# Altium footprint library Socket DIP.PCBLIB: 18 footprints (part 1 of 2)
Each footprint in its own frame and in the unit in brackets; x right, y up, seen from the top. Pads: shape width x height; smd on the part's side, far side on the other; paste and mask are expansions set on the pad; w line width, h text height; cw(c..) or ccw(c..) is an arc to the next point about the centre after c.
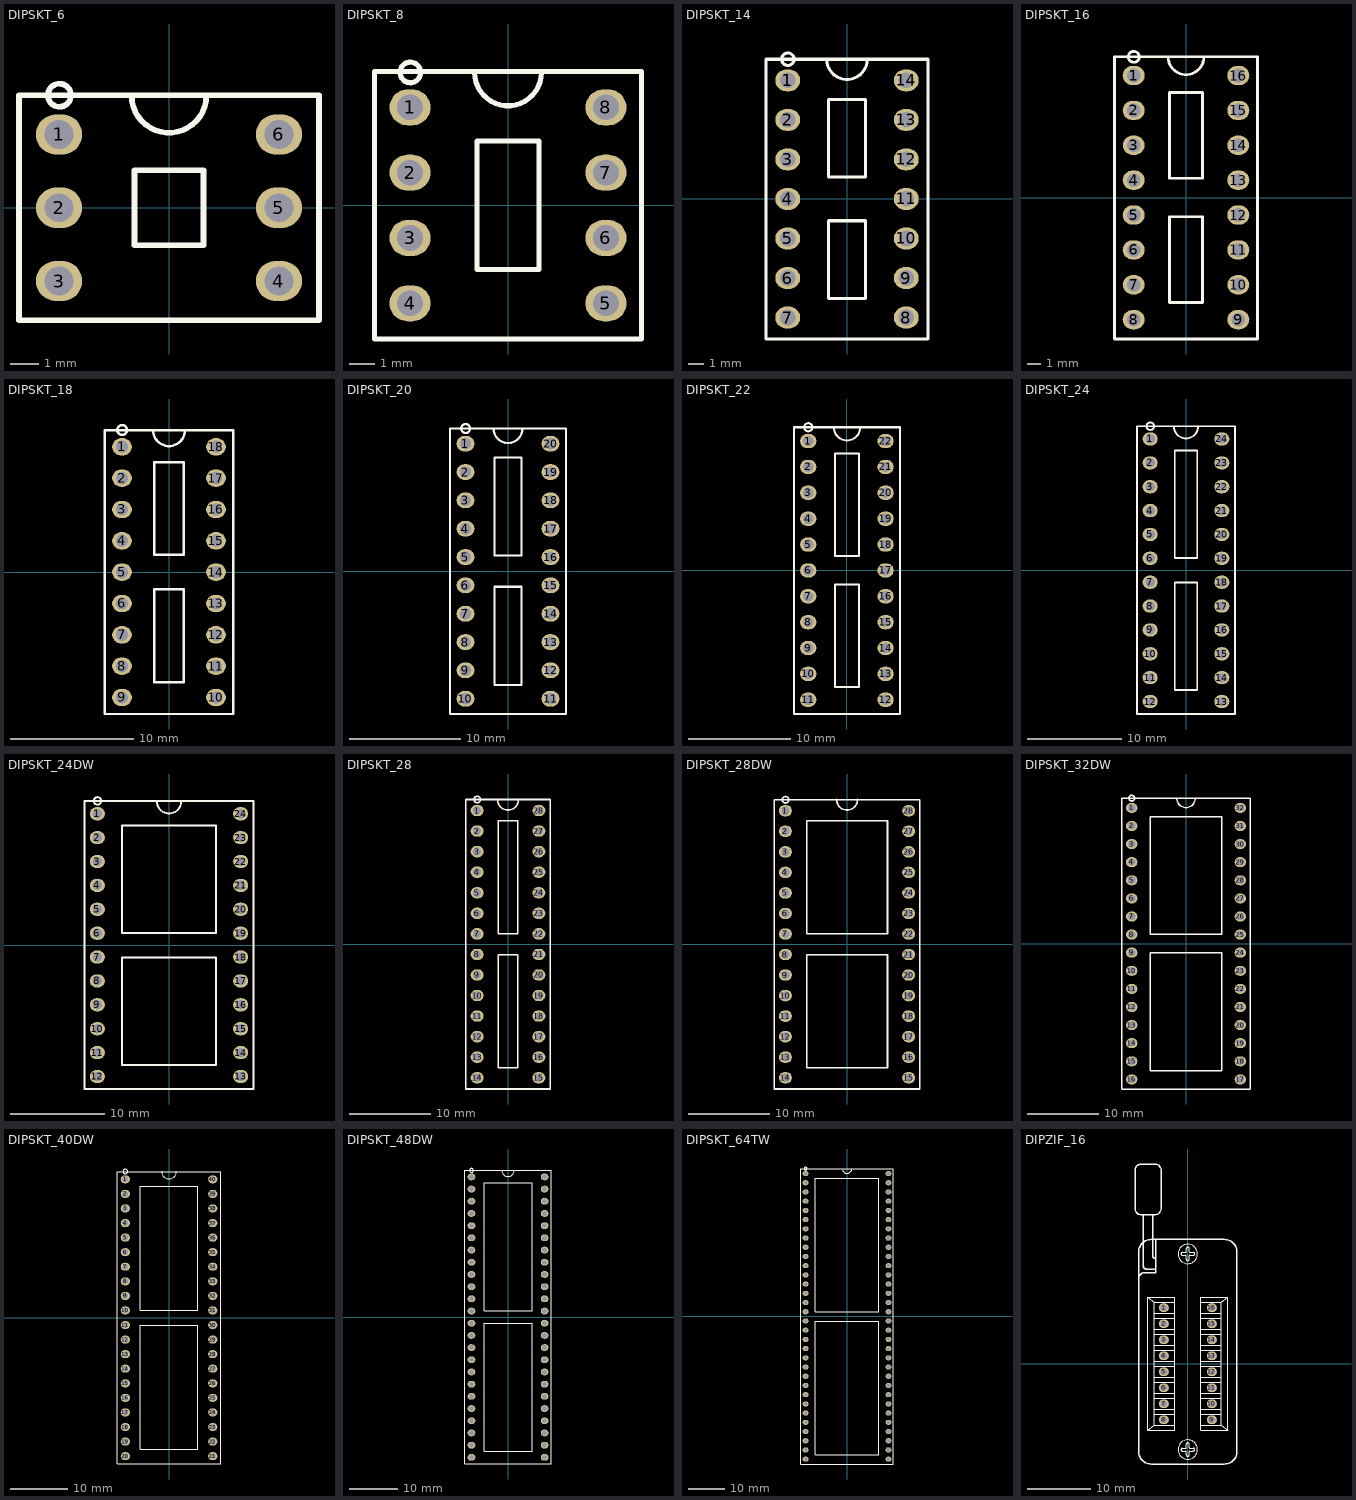
[diagram p0: the footprints below, top view; thin cyan lines are the x and y axes]

## DIPSKT_6 [mm] "SOCKET DIP, pitch 2.54mm, 300mil Width"
pads (6):
  oval 1.6x1.4 / inner round 1.4 / far side oval 2.2x1.4 hole 1: 1(-3.81,2.54) 2(-3.81,0) 3(-3.81,-2.54) 4(3.81,-2.54) 5(3.81,0) 6(3.81,2.54)
TopOverlay:
  circle w0.2: c-3.8,3.9 r0.4
  lines w0.2: -1.3,3.9 ccw(c0,3.9) 1.3,3.9 ; -5.2,-3.9 -5.2,3.9 5.2,3.9 5.2,-3.9 -5.2,-3.9 ; -1.2,-1.3 -1.2,1.3 1.2,1.3 1.2,-1.3 -1.2,-1.3
3D body "User Library-6pin 0_3inch 2_54mm IC DIP Gold Socket.step": height 5, standoff -3, extent -5.08,-3.8 5.08,3.82

## DIPSKT_8 [mm] "SOCKET DIP, pitch 2.54mm, 300mil Width"
pads (8):
  oval 1.6x1.4 / inner round 1.4 / far side oval 2.2x1.4 hole 1: 1(-3.81,3.81) 2(-3.81,1.27) 3(-3.81,-1.27) 4(-3.81,-3.81) 5(3.81,-3.81) 6(3.81,-1.27) 7(3.81,1.27) 8(3.81,3.81)
TopOverlay:
  circle w0.2: c-3.8,5.17 r0.4
  lines w0.2: -1.3,5.17 ccw(c0,5.17) 1.3,5.17 ; -5.2,-5.2 -5.2,5.2 5.2,5.2 5.2,-5.2 -5.2,-5.2 ; -1.2,-2.5 -1.2,2.5 1.2,2.5 1.2,-2.5 -1.2,-2.5
3D body "User Library-8pin 0_3inch 2_54mm IC DIP Gold Socket.step": height 5, standoff -3, extent -5.06,-5.08 5.1,5.08

## DIPSKT_14 [mm] "SOCKET DIP, pitch 2.54mm, 300mil Width"
pads (14):
  oval 1.6x1.4 / inner round 1.4 / far side oval 2.2x1.4 hole 1: 1(-3.81,7.62) 2(-3.81,5.08) 3(-3.81,2.54) 4(-3.81,0) 5(-3.81,-2.54) 6(-3.81,-5.08) 7(-3.81,-7.62) 8(3.81,-7.62) 9(3.81,-5.08) 10(3.81,-2.54) 11(3.81,0) 12(3.81,2.54) 13(3.81,5.08) 14(3.81,7.62)
TopOverlay:
  circle w0.2: c-3.8,8.98 r0.4
  lines w0.2: -1.3,8.98 ccw(c0,8.98) 1.3,8.98 ; -5.2,-9 -5.2,8.98 5.2,8.98 5.2,-9 -5.2,-9 ; -1.2,-6.4 1.2,-6.4 1.2,-1.4 -1.2,-1.4 -1.2,-6.4 ; -1.2,1.4 -1.2,6.4 1.2,6.4 1.2,1.4 -1.2,1.4
3D body "User Library-14pin 0_3inch 2_54mm IC DIP Socket.step": height 5, standoff -3, extent -5.08,-8.9 5.08,8.88

## DIPSKT_16 [mm] "SOCKET DIP, pitch 2.54mm, 300mil Width"
pads (16):
  oval 1.6x1.4 / inner round 1.4 / far side oval 2.2x1.4 hole 1: 1(-3.81,8.89) 2(-3.81,6.35) 3(-3.81,3.81) 4(-3.81,1.27) 5(-3.81,-1.27) 6(-3.81,-3.81) 7(-3.81,-6.35) 8(-3.81,-8.89) 9(3.81,-8.89) 10(3.81,-6.35) 11(3.81,-3.81) 12(3.81,-1.27) 13(3.81,1.27) 14(3.81,3.81) 15(3.81,6.35) 16(3.81,8.89)
TopOverlay:
  circle w0.2: c-3.8,10.25 r0.4
  lines w0.2: -1.3,10.25 ccw(c0,10.25) 1.3,10.25 ; -5.2,-10.3 -5.2,10.25 5.2,10.25 5.2,-10.3 -5.2,-10.3 ; -1.2,-7.65 1.2,-7.65 1.2,-1.4 -1.2,-1.4 -1.2,-7.65 ; -1.2,1.4 -1.2,7.65 1.2,7.65 1.2,1.4 -1.2,1.4
3D body "User Library-16pin 0_3inch 2_54mm IC DIP Gold Socket.step": height 5, standoff -3, extent -5.06,-10.16 5.1,10.16

## DIPSKT_18 [mm] "SOCKET DIP, pitch 2.54mm, 300mil Width"
pads (18):
  oval 1.6x1.4 / inner round 1.4 / far side oval 2.2x1.4 hole 1: 1(-3.81,10.16) 2(-3.81,7.62) 3(-3.81,5.08) 4(-3.81,2.54) 5(-3.81,0) 6(-3.81,-2.54) 7(-3.81,-5.08) 8(-3.81,-7.62) 9(-3.81,-10.16) 10(3.81,-10.16) 11(3.81,-7.62) 12(3.81,-5.08) 13(3.81,-2.54) 14(3.81,0) 15(3.81,2.54) 16(3.81,5.08) 17(3.81,7.62) 18(3.81,10.16)
TopOverlay:
  circle w0.2: c-3.8,11.52 r0.4
  lines w0.2: -1.3,11.52 ccw(c0,11.52) 1.3,11.52 ; -5.2,-11.5 5.2,-11.5 5.2,11.52 -5.2,11.52 -5.2,-11.5 ; -1.2,-8.92 -1.2,-1.4 1.2,-1.4 1.2,-8.92 -1.2,-8.92 ; -1.2,1.4 1.2,1.4 1.2,8.92 -1.2,8.92 -1.2,1.4
3D body "User Library-18pin 0_3inch 2_54mm IC DIP Gold Socket.step": height 5, standoff -3, extent -5.08,-11.4 5.08,11.46

## DIPSKT_20 [mm] "SOCKET DIP, pitch 2.54mm, 300mil Width"
pads (20):
  oval 1.6x1.4 / inner round 1.4 / far side oval 2.2x1.4 hole 1: 1(-3.81,11.43) 2(-3.81,8.89) 3(-3.81,6.35) 4(-3.81,3.81) 5(-3.81,1.27) 6(-3.81,-1.27) 7(-3.81,-3.81) 8(-3.81,-6.35) 9(-3.81,-8.89) 10(-3.81,-11.43) 11(3.81,-11.43) 12(3.81,-8.89) 13(3.81,-6.35) 14(3.81,-3.81) 15(3.81,-1.27) 16(3.81,1.27) 17(3.81,3.81) 18(3.81,6.35) 19(3.81,8.89) 20(3.81,11.43)
TopOverlay:
  circle w0.2: c-3.8,12.79 r0.4
  lines w0.2: -1.3,12.79 ccw(c0,12.79) 1.3,12.79 ; -5.2,-12.8 -5.2,12.79 5.2,12.79 5.2,-12.8 -5.2,-12.8 ; -1.2,-10.19 1.2,-10.19 1.2,-1.4 -1.2,-1.4 -1.2,-10.19 ; -1.2,1.4 -1.2,10.19 1.2,10.19 1.2,1.4 -1.2,1.4
3D body "User Library-20pin 0_3inch 2_54mm IC DIP Gold Socket.step": height 5, standoff -3, extent -5.08,-12.7 5.08,12.7

## DIPSKT_22 [mm] "SOCKET DIP, pitch 2.54mm, 400mil Width, 28X10mm"
pads (22):
  oval 1.6x1.4 / inner round 1.4 / far side oval 2.2x1.4 hole 1: 1(-3.8,12.7) 2(-3.8,10.16) 3(-3.8,7.62) 4(-3.8,5.08) 5(-3.8,2.54) 6(-3.8,0) 7(-3.8,-2.54) 8(-3.8,-5.08) 9(-3.8,-7.62) 10(-3.8,-10.16) 11(-3.8,-12.7) 12(3.8,-12.7) 13(3.8,-10.16) 14(3.8,-7.62) 15(3.8,-5.08) 16(3.8,-2.54) 17(3.8,0) 18(3.8,2.54) 19(3.8,5.08) 20(3.8,7.62) 21(3.8,10.16) 22(3.8,12.7)
TopOverlay:
  circle w0.2: c-3.79,14.06 r0.4
  lines w0.2: -1.29,14.06 ccw(c0.01,14.06) 1.31,14.06 ; -5.19,-14.1 -5.19,14.06 5.21,14.06 5.21,-14.1 -5.19,-14.1 ; -1.19,-11.46 1.21,-11.46 1.21,-1.4 -1.19,-1.4 -1.19,-11.46 ; -1.19,1.4 -1.19,11.46 1.21,11.46 1.21,1.4 -1.19,1.4
3D body "User Library-22pin 0_3inch 2_54mm IC DIP Gold Socket.step": height 5, standoff -3, extent -5.06,-13.97 5.1,13.97

## DIPSKT_24 [mm] "SOCKET DIP, pitch 2.54mm, 300mil Width"
pads (24):
  oval 1.6x1.4 / inner round 1.4 / far side oval 2.2x1.4 hole 1: 1(-3.81,13.97) 2(-3.81,11.43) 3(-3.81,8.89) 4(-3.81,6.35) 5(-3.81,3.81) 6(-3.81,1.27) 7(-3.81,-1.27) 8(-3.81,-3.81) 9(-3.81,-6.35) 10(-3.81,-8.89) 11(-3.81,-11.43) 12(-3.81,-13.97) 13(3.81,-13.97) 14(3.81,-11.43) 15(3.81,-8.89) 16(3.81,-6.35) 17(3.81,-3.81) 18(3.81,-1.27) 19(3.81,1.27) 20(3.81,3.81) 21(3.81,6.35) 22(3.81,8.89) 23(3.81,11.43) 24(3.81,13.97)
TopOverlay:
  circle w0.2: c-3.8,15.33 r0.4
  lines w0.2: -1.3,15.33 ccw(c0,15.33) 1.3,15.33 ; -5.2,-15.3 5.2,-15.3 5.2,15.33 -5.2,15.33 -5.2,-15.3 ; -1.2,-12.73 -1.2,-1.3 1.2,-1.3 1.2,-12.73 -1.2,-12.73 ; -1.2,1.3 1.2,1.3 1.2,12.73 -1.2,12.73 -1.2,1.3
3D body "User Library-24pin 0_3inch 2_54mm IC DIP Gold Socket.step": height 5, standoff -3, extent -5.07,-15.24 5.09,15.24

## DIPSKT_24DW [mm] "SOCKET DIP, pitch 2.54mm, 600mil Width"
pads (24):
  oval 1.6x1.4 / inner round 1.4 / far side oval 2.2x1.4 hole 1: 1(-7.62,13.97) 2(-7.62,11.43) 3(-7.62,8.89) 4(-7.62,6.35) 5(-7.62,3.81) 6(-7.62,1.27) 7(-7.62,-1.27) 8(-7.62,-3.81) 9(-7.62,-6.35) 10(-7.62,-8.89) 11(-7.62,-11.43) 12(-7.62,-13.97) 13(7.62,-13.97) 14(7.62,-11.43) 15(7.62,-8.89) 16(7.62,-6.35) 17(7.62,-3.81) 18(7.62,-1.27) 19(7.62,1.27) 20(7.62,3.81) 21(7.62,6.35) 22(7.62,8.89) 23(7.62,11.43) 24(7.62,13.97)
TopOverlay:
  circle w0.2: c-7.61,15.33 r0.4
  lines w0.2: -1.3,15.3 ccw(c0,15.3) 1.3,15.3 ; -9.01,-15.3 -9.01,15.33 9,15.33 9,-15.3 -9.01,-15.3 ; -5,-12.73 5,-12.73 5,-1.3 -5,-1.3 -5,-12.73 ; -5,1.3 -5,12.73 5,12.73 5,1.3 -5,1.3
3D body "User Library-24pin 0_6inch 2_54mm IC DIP Socket.step": height 5, standoff -3, extent -8.89,-15.2 8.89,15.28

## DIPSKT_28 [mm] "SOCKET DIP, pitch 2.54mm, 300mil Width"
pads (28):
  oval 1.6x1.4 / inner round 1.4 / far side oval 2.2x1.4 hole 1: 1(-3.81,16.51) 2(-3.81,13.97) 3(-3.81,11.43) 4(-3.81,8.89) 5(-3.81,6.35) 6(-3.81,3.81) 7(-3.81,1.27) 8(-3.81,-1.27) 9(-3.81,-3.81) 10(-3.81,-6.35) 11(-3.81,-8.89) 12(-3.81,-11.43) 13(-3.81,-13.97) 14(-3.81,-16.51) 15(3.81,-16.51) 16(3.81,-13.97) 17(3.81,-11.43) 18(3.81,-8.89) 19(3.81,-6.35) 20(3.81,-3.81) 21(3.81,-1.27) 22(3.81,1.27) 23(3.81,3.81) 24(3.81,6.35) 25(3.81,8.89) 26(3.81,11.43) 27(3.81,13.97) 28(3.81,16.51)
TopOverlay:
  circle w0.2: c-3.8,17.87 r0.4
  lines w0.2: -1.3,17.87 ccw(c0,17.87) 1.3,17.87 ; -5.2,-17.9 5.2,-17.9 5.2,17.87 -5.2,17.87 -5.2,-17.9 ; -1.2,-15.27 -1.2,-1.3 1.2,-1.3 1.2,-15.27 -1.2,-15.27 ; -1.2,1.3 1.2,1.3 1.2,15.27 -1.2,15.27 -1.2,1.3
3D body "User Library-28pin 0_3inch 2_54mm IC DIP Gold Socket.step": height 5, standoff -3, extent -5.06,-17.78 5.1,17.78

## DIPSKT_28DW [mm] "SOCKET DIP, pitch 2.54mm, 600mil Width"
pads (28):
  oval 1.6x1.4 / inner round 1.4 / far side oval 2.2x1.4 hole 1: 1(-7.62,16.51) 2(-7.62,13.97) 3(-7.62,11.43) 4(-7.62,8.89) 5(-7.62,6.35) 6(-7.62,3.81) 7(-7.62,1.27) 8(-7.62,-1.27) 9(-7.62,-3.81) 10(-7.62,-6.35) 11(-7.62,-8.89) 12(-7.62,-11.43) 13(-7.62,-13.97) 14(-7.62,-16.51) 15(7.62,-16.51) 16(7.62,-13.97) 17(7.62,-11.43) 18(7.62,-8.89) 19(7.62,-6.35) 20(7.62,-3.81) 21(7.62,-1.27) 22(7.62,1.27) 23(7.62,3.81) 24(7.62,6.35) 25(7.62,8.89) 26(7.62,11.43) 27(7.62,13.97) 28(7.62,16.51)
TopOverlay:
  circle w0.2: c-7.61,17.87 r0.4
  lines w0.2: -1.3,17.9 ccw(c0,17.9) 1.3,17.9 ; -9.01,-17.9 9,-17.9 9,17.87 -9.01,17.87 -9.01,-17.9 ; -5,-15.27 -5,-1.3 5,-1.3 5,-15.27 -5,-15.27 ; -5,1.3 5,1.3 5,15.27 -5,15.27 -5,1.3
3D body "User Library-28pin 0_6inch 2_54mm IC DIP Gold Socket.step": height 5, standoff -3, extent -9,-17.78 8.78,17.78

## DIPSKT_32DW [mm] "SOCKET DIP, pitch 2.54mm, 600mil Width"
pads (32):
  oval 1.6x1.4 / inner round 1.4 / far side oval 2.2x1.4 hole 1: 1(-7.62,19.05) 2(-7.62,16.51) 3(-7.62,13.97) 4(-7.62,11.43) 5(-7.62,8.89) 6(-7.62,6.35) 7(-7.62,3.81) 8(-7.62,1.27) 9(-7.62,-1.27) 10(-7.62,-3.81) 11(-7.62,-6.35) 12(-7.62,-8.89) 13(-7.62,-11.43) 14(-7.62,-13.97) 15(-7.62,-16.51) 16(-7.62,-19.05) 17(7.62,-19.05) 18(7.62,-16.51) 19(7.62,-13.97) 20(7.62,-11.43) 21(7.62,-8.89) 22(7.62,-6.35) 23(7.62,-3.81) 24(7.62,-1.27) 25(7.62,1.27) 26(7.62,3.81) 27(7.62,6.35) 28(7.62,8.89) 29(7.62,11.43) 30(7.62,13.97) 31(7.62,16.51) 32(7.62,19.05)
TopOverlay:
  circle w0.2: c-7.61,20.41 r0.4
  lines w0.2: -1.3,20.4 ccw(c0,20.4) 1.3,20.4 ; -9,-20.4 9,-20.4 9,20.41 -9,20.41 -9,-20.4 ; -5,-17.81 -5,-1.3 5,-1.3 5,-17.81 -5,-17.81 ; -5,1.3 5,1.3 5,17.81 -5,17.81 -5,1.3
3D body "User Library-32pin 0_6inch 2_54mm IC DIP Gold Socket.step": height 5, standoff -3, extent -8.89,-20.3 8.89,20.34

## DIPSKT_40DW [mm] "SOCKET DIP, pitch 2.54mm, 600mil Width"
pads (40):
  oval 1.6x1.4 / inner round 1.4 / far side oval 2.2x1.4 hole 1: 1(-7.62,24.13) 2(-7.62,21.59) 3(-7.62,19.05) 4(-7.62,16.51) 5(-7.62,13.97) 6(-7.62,11.43) 7(-7.62,8.89) 8(-7.62,6.35) 9(-7.62,3.81) 10(-7.62,1.27) 11(-7.62,-1.27) 12(-7.62,-3.81) 13(-7.62,-6.35) 14(-7.62,-8.89) 15(-7.62,-11.43) 16(-7.62,-13.97) 17(-7.62,-16.51) 18(-7.62,-19.05) 19(-7.62,-21.59) 20(-7.62,-24.13) 21(7.62,-24.13) 22(7.62,-21.59) 23(7.62,-19.05) 24(7.62,-16.51) 25(7.62,-13.97) 26(7.62,-11.43) 27(7.62,-8.89) 28(7.62,-6.35) 29(7.62,-3.81) 30(7.62,-1.27) 31(7.62,1.27) 32(7.62,3.81) 33(7.62,6.35) 34(7.62,8.89) 35(7.62,11.43) 36(7.62,13.97) 37(7.62,16.51) 38(7.62,19.05) 39(7.62,21.59) 40(7.62,24.13)
TopOverlay:
  circle w0.2: c-7.61,25.49 r0.4
  lines w0.2: -1.3,25.5 ccw(c0,25.5) 1.3,25.5 ; -9.01,-25.5 -9.01,25.49 9,25.49 9,-25.5 -9.01,-25.5 ; -5,-22.89 5,-22.89 5,-1.3 -5,-1.3 -5,-22.89 ; -5,1.3 -5,22.89 5,22.89 5,1.3 -5,1.3
3D body "User Library-40pin 0_6inch 2_54mm IC DIP Gold Socket.step": height 5, standoff -3, extent -8.9,-25.4 8.88,25.4

## DIPSKT_48DW [mm] "SOCKET DIP, pitch 2.54mm, 600mil Width"
pads (48):
  oval 1.6x1.4 / inner round 1.4 / far side oval 2.2x1.4 hole 1: 1(-7.62,29.21) 2(-7.62,26.67) 3(-7.62,24.13) 4(-7.62,21.59) 5(-7.62,19.05) 6(-7.62,16.51) 7(-7.62,13.97) 8(-7.62,11.43) 9(-7.62,8.89) 10(-7.62,6.35) 11(-7.62,3.81) 12(-7.62,1.27) 13(-7.62,-1.27) 14(-7.62,-3.81) 15(-7.62,-6.35) 16(-7.62,-8.89) 17(-7.62,-11.43) 18(-7.62,-13.97) 19(-7.62,-16.51) 20(-7.62,-19.05) 21(-7.62,-21.59) 22(-7.62,-24.13) 23(-7.62,-26.67) 24(-7.62,-29.21) 25(7.62,-29.21) 26(7.62,-26.67) 27(7.62,-24.13) 28(7.62,-21.59) 29(7.62,-19.05) 30(7.62,-16.51) 31(7.62,-13.97) 32(7.62,-11.43) 33(7.62,-8.89) 34(7.62,-6.35) 35(7.62,-3.81) 36(7.62,-1.27) 37(7.62,1.27) 38(7.62,3.81) 39(7.62,6.35) 40(7.62,8.89) 41(7.62,11.43) 42(7.62,13.97) 43(7.62,16.51) 44(7.62,19.05) 45(7.62,21.59) 46(7.62,24.13) 47(7.62,26.67) 48(7.62,29.21)
TopOverlay:
  circle w0.2: c-7.61,30.57 r0.4
  lines w0.2: -1.3,30.6 ccw(c0,30.6) 1.3,30.6 ; -9.01,-30.6 9,-30.6 9,30.57 -9.01,30.57 -9.01,-30.6 ; -5,-27.97 -5,-1.3 5,-1.3 5,-27.97 -5,-27.97 ; -5,1.3 5,1.3 5,27.97 -5,27.97 -5,1.3
3D body "User Library-48pin 0_6inch 2_54mm IC DIP Gold Socket.step": height 5, standoff -3, extent -8.88,-30.48 8.9,30.48

## DIPSKT_64TW [mm] "SOCKET DIP, pitch 2.54mm, 900mil Width"
pads (64):
  oval 1.6x1.4 / inner round 1.4 / far side oval 2.2x1.4 hole 1: 1(-11.43,39.37) 2(-11.43,36.83) 3(-11.43,34.29) 4(-11.43,31.75) 5(-11.43,29.21) 6(-11.43,26.67) 7(-11.43,24.13) 8(-11.43,21.59) 9(-11.43,19.05) 10(-11.43,16.51) 11(-11.43,13.97) 12(-11.43,11.43) 13(-11.43,8.89) 14(-11.43,6.35) 15(-11.43,3.81) 16(-11.43,1.27) 17(-11.43,-1.27) 18(-11.43,-3.81) 19(-11.43,-6.35) 20(-11.43,-8.89) 21(-11.43,-11.43) 22(-11.43,-13.97) 23(-11.43,-16.51) 24(-11.43,-19.05) 25(-11.43,-21.59) 26(-11.43,-24.13) 27(-11.43,-26.67) 28(-11.43,-29.21) 29(-11.43,-31.75) 30(-11.43,-34.29) 31(-11.43,-36.83) 32(-11.43,-39.37) 33(11.43,-39.37) 34(11.43,-36.83) 35(11.43,-34.29) 36(11.43,-31.75) 37(11.43,-29.21) 38(11.43,-26.67) 39(11.43,-24.13) 40(11.43,-21.59) 41(11.43,-19.05) 42(11.43,-16.51) 43(11.43,-13.97) 44(11.43,-11.43) 45(11.43,-8.89) 46(11.43,-6.35) 47(11.43,-3.81) 48(11.43,-1.27) 49(11.43,1.27) 50(11.43,3.81) 51(11.43,6.35) 52(11.43,8.89) 53(11.43,11.43) 54(11.43,13.97) 55(11.43,16.51) 56(11.43,19.05) 57(11.43,21.59) 58(11.43,24.13) 59(11.43,26.67) 60(11.43,29.21) 61(11.43,31.75) 62(11.43,34.29) 63(11.43,36.83) 64(11.43,39.37)
TopOverlay:
  circle w0.2: c-11.42,40.73 r0.4
  lines w0.2: -1.3,40.7 ccw(c0,40.7) 1.3,40.7 ; -12.82,-40.7 -12.82,40.73 12.8,40.73 12.8,-40.7 -12.82,-40.7 ; -8.8,-38.13 8.8,-38.13 8.8,-1.3 -8.8,-1.3 -8.8,-38.13 ; -8.8,1.3 -8.8,38.13 8.8,38.13 8.8,1.3 -8.8,1.3
3D body "User Library-64pin 0_9inch 2_54mm IC DIP Gold Socket.step": height 5, standoff -3, extent -12.7,-40.64 12.7,40.64

## DIPZIF_16 [mm] "SOCKET ZIF DIP, pitch 2.54mm, 300mil Width"
pads (16):
  oval 1.6x1.4 / inner round 1.4 / far side oval 2.2x1.4 hole 1: 1(-3.81,8.89) 2(-3.81,6.35) 3(-3.81,3.81) 4(-3.81,1.27) 5(-3.81,-1.27) 6(-3.81,-3.81) 7(-3.81,-6.35) 8(-3.81,-8.89) 9(3.81,-8.89) 10(3.81,-6.35) 11(3.81,-3.81) 12(3.81,-1.27) 13(3.81,1.27) 14(3.81,3.81) 15(3.81,6.35) 16(3.81,8.89)
TopOverlay:
  circle w0.102: c0,17.41 r1.53
  circle w0.102: c0,-13.61 r1.53
  lines w0.102: -5.334,-8.001 -2.032,-8.001 ; -5.334,-7.239 -2.032,-7.239 ; -5.334,-5.461 -2.032,-5.461 ; -5.334,-4.699 -2.032,-4.699 ; -5.334,-2.921 -2.032,-2.921 ; -5.334,-2.159 -2.032,-2.159 ; -5.334,-0.381 -2.032,-0.381 ; -5.334,0.381 -2.032,0.381 ; -5.334,2.159 -2.032,2.159 ; -5.334,2.921 -2.032,2.921 ; -5.334,4.699 -2.032,4.699 ; -5.334,5.461 -2.032,5.461 ; -5.334,7.239 -2.032,7.239 ; -5.334,8.001 -2.032,8.001 ; -2.032,-9.779 -5.334,-9.779 ; -2.032,9.779 -5.334,9.779 ; -0.85,17.18 cw(c-0.85,17.41) -1.08,17.41 cw(c-0.85,17.41) -0.85,17.64 -0.31,17.64 ; -0.85,17.18 -0.3,17.18 ; -0.31,-13.84 -0.85,-13.84 cw(c-0.85,-13.61) -1.08,-13.61 cw(c-0.85,-13.61) -0.85,-13.38 -0.3,-13.38 ; -0.3,-13.84 cw(c-0.3,-13.91) -0.23,-13.91 -0.23,-14.46 ccw(c0,-14.46) 0,-14.69 ccw(c0,-14.46) 0.23,-14.46 0.23,-13.92 ; -0.3,-13.37 ccw(c-0.3,-13.3) -0.23,-13.3 -0.23,-12.76 cw(c0,-12.76) 0,-12.53 cw(c0,-12.76) 0.23,-12.76 0.23,-13.31 ccw(c0.3,-13.31) 0.3,-13.38 ; -0.3,17.17 cw(c-0.3,17.1) -0.23,17.1 -0.23,16.56 ccw(c0,16.56) 0,16.33 ccw(c0,16.56) 0.23,16.56 0.23,17.11 cw(c0.3,17.11) 0.3,17.18 ; -0.3,17.64 ccw(c-0.3,17.71) -0.23,17.71 -0.23,18.26 cw(c0,18.26) 0,18.49 cw(c0,18.26) 0.23,18.26 0.23,17.72 ; 0.23,-13.91 cw(c0.3,-13.91) 0.3,-13.84 ; 0.23,17.71 ccw(c0.3,17.71) 0.3,17.64 0.85,17.64 cw(c0.85,17.41) 1.08,17.41 cw(c0.85,17.41) 0.85,17.18 ; 0.3,-13.84 0.85,-13.84 ccw(c0.85,-13.61) 1.08,-13.61 ccw(c0.85,-13.61) 0.85,-13.38 0.31,-13.38 ; 0.31,17.18 0.85,17.18 ; 2.032,-9.779 5.334,-9.779 ; 2.032,-8.001 5.334,-8.001 ; 2.032,-7.239 5.334,-7.239 ; 2.032,-5.461 5.334,-5.461 ; 2.032,-4.699 5.334,-4.699 ; 2.032,-2.921 5.334,-2.921 ; 2.032,-2.159 5.334,-2.159 ; 2.032,-0.381 5.334,-0.381 ; 2.032,0.381 5.334,0.381 ; 2.032,2.159 5.334,2.159 ; 2.032,2.921 5.334,2.921 ; 2.032,4.699 5.334,4.699 ; 2.032,5.461 5.334,5.461 ; 2.032,7.239 5.334,7.239 ; 2.032,8.001 5.334,8.001 ; 2.032,9.779 5.334,9.779 ; -6.35,-10.541 -5.334,-9.779 ; -6.35,-10.541 -2.032,-10.541 -2.032,10.541 -6.35,10.541 ; -6.35,-10.541 -6.35,10.541 ; -6.35,10.541 -5.334,9.779 ; -5.334,-9.779 -5.334,9.779 ; 5.334,-9.779 5.334,9.779 ; 5.334,-9.779 6.35,-10.541 ; 5.334,9.779 6.35,10.541 ; 6.35,-10.541 6.35,10.541 ; 6.35,-10.541 2.032,-10.541 2.032,10.541 6.35,10.541
  lines w0.2: -7.8,13.4 cw(c-6.8,13.449) -6.8,14.45 -5.1,14.45 -5.1,19.7 ; -7.1,23.57 -7.1,15.6 ccw(c-6.5,15.6) -6.5,15 -5.1,15 ; -5.55,23.57 -5.55,17.1 ccw(c-5.15,17.1) -5.15,16.7 ; -8.37,24.62 ccw(c-7.37,24.62) -7.37,23.62 -5.23,23.62 ccw(c-5.23,24.62) -4.23,24.62 -4.23,30.67 ccw(c-5.23,30.67) -5.23,31.67 -7.37,31.67 ccw(c-7.37,30.67) -8.37,30.67 -8.37,24.62 ; -7.8,-13.9 ccw(c-5.8,-13.9) -5.8,-15.9 5.8,-15.9 ccw(c5.8,-13.9) 7.8,-13.9 7.8,17.7 ccw(c5.8,17.7) 5.8,19.7 -5.8,19.7 ccw(c-5.8,17.7) -7.8,17.7 -7.8,-13.9
3D body "User Library-16 pin IC ZIF Socket closed.STEP": height 12.1, standoff -3, extent -8.4,-15.828 7.65,32.035